# Altium schematic symbol library Capacitor - Aluminium TH.SchLib: 4591 symbols (part 3 of 27) (continued)
## 228CKS050M (continued)
CAP ALUM 2200UF 20% 50V T/H; Part Number: 228CKS050M; Manufacturer: Illinois Capacitor; TemperatureRange: -40C ~ 85C; Type: Polar; Ripple Current: 2.39A @ 120Hz; Value: 2200uF; PartId: 27371; Supplier 1: Digi-Key; Supplier Part Number 1: 1572-1413-ND; ComponentLink1Description: Datasheet; ComponentLink1URL: http://www.illinoiscapacitor.com/pdf/seriesDocuments/CKR_CKS%20series.pdf; ComponentLink2Description: Digi-Key Listing; ComponentLink2URL: https://www.digikey.com/product-detail/en/illinois-capacitor/228CKS050M/1572-1413-ND/5411845; Tolerance: 20%; Voltage: 50V; Price: 1.79; Device Package: Radial, Can, 16mm
footprint CAP AL TH D16 L7.5 H37
pins: 1, 2

## 228KXM016M
designator C?, comment 2200uF  (value not drawn)
CAP ALUM 2200UF 20% 16V T/H; Part Number: 228KXM016M; Manufacturer: Illinois Capacitor; TemperatureRange: -55C ~ 105C; Type: Polar; Ripple Current: 2.078A @ 120Hz; Impedance: 45 mOhm; Value: 2200uF; PartId: 23862; Supplier 1: Digi-Key; Supplier Part Number 1: 1572-1414-ND; ComponentLink1Description: Datasheet; ComponentLink1URL: http://www.illinoiscapacitor.com/pdf/seriesDocuments/KXM%20series.pdf; ComponentLink2Description: Digi-Key Listing; ComponentLink2URL: https://www.digikey.com/product-detail/en/illinois-capacitor/228KXM016M/1572-1414-ND/5411851; Tolerance: 20%; Voltage: 16V; Price: 0.74; Device Package: Radial, Can, 12.5mm
footprint CAP AL TH D12.5 L5 H27
pins: 1, 2

## 250BXC10MEFC10X16
designator C?, comment 10uF  (value not drawn)
CAP ALUM 10UF 20% 250V RADIAL; Part Number: 250BXC10MEFC10X16; Manufacturer: Rubycon; TemperatureRange: -25C ~ 105C; Type: Polar; Ripple Current: 96mA @ 120Hz; Value: 10uF; PartId: 25606; Supplier 1: Digi-Key; Supplier Part Number 1: 1189-3680-ND; ComponentLink1Description: Datasheet; ComponentLink1URL: http://www.rubycon.co.jp/en/catalog/e_pdfs/aluminum/e_bxc.pdf; ComponentLink2Description: Digi-Key Listing; ComponentLink2URL: https://www.digikey.com/product-detail/en/rubycon/250BXC10MEFC10X16/1189-3680-ND/3563641; Tolerance: 20%; Voltage: 250V; Price: 0.69; Device Package: Radial, Can, 10mm
footprint CAP AL TH D10 L5 H22
pins: 1, 2

## 250BXC22MEFC10X16
designator C?, comment 22uF  (value not drawn)
CAP ALUM 22UF 20% 250V RADIAL; Part Number: 250BXC22MEFC10X16; Manufacturer: Rubycon; TemperatureRange: -25C ~ 105C; Type: Polar; Ripple Current: 188mA; Value: 22uF; PartId: 25542; Supplier 1: Digi-Key; Supplier Part Number 1: 1189-1892-ND; ComponentLink1Description: Datasheet; ComponentLink1URL: http://www.rubycon.co.jp/en/catalog/e_pdfs/aluminum/e_bxc.pdf; ComponentLink2Description: Digi-Key Listing; ComponentLink2URL: https://www.digikey.com/product-detail/en/rubycon/250BXC22MEFC10X16/1189-1892-ND/3563640; Tolerance: 20%; Voltage: 250V; Price: 0.63; Device Package: Radial, Can, 10mm
footprint CAP AL TH D10 L5 H22
pins: 1, 2

## 250BXC22MEFC10X20
designator C?, comment 22uF  (value not drawn)
CAP ALUM 22UF 20% 250V RADIAL; Part Number: 250BXC22MEFC10X20; Manufacturer: Rubycon; TemperatureRange: -25C ~ 105C; Type: Polar; Ripple Current: 200mA; Value: 22uF; PartId: 25955; Supplier 1: Digi-Key; Supplier Part Number 1: 1189-2213-ND; ComponentLink1Description: Datasheet; ComponentLink1URL: http://www.rubycon.co.jp/en/catalog/e_pdfs/aluminum/e_bxc.pdf; ComponentLink2Description: Digi-Key Listing; ComponentLink2URL: https://www.digikey.com/product-detail/en/rubycon/250BXC22MEFC10X20/1189-2213-ND/3563741; Tolerance: 20%; Voltage: 250V; Price: 0.79; Device Package: Radial, Can, 10mm
footprint CAP AL TH D10 L5 H22
pins: 1, 2

## 250BXC47MEFC12.5X20
designator C?, comment 47uF  (value not drawn)
CAP ALUM 47UF 20% 250V RADIAL; Part Number: 250BXC47MEFC12.5X20; Manufacturer: Rubycon; TemperatureRange: -25C ~ 105C; Type: Polar; Ripple Current: 392mA; Value: 47uF; PartId: 23382; Supplier 1: Digi-Key; Supplier Part Number 1: 1189-2215-ND; ComponentLink1Description: Datasheet; ComponentLink1URL: http://www.rubycon.co.jp/en/catalog/e_pdfs/aluminum/e_bxc.pdf; ComponentLink2Description: Digi-Key Listing; ComponentLink2URL: https://www.digikey.com/product-detail/en/rubycon/250BXC47MEFC12.5X20/1189-2215-ND/3563982; Tolerance: 20%; Voltage: 250V; Price: 0.93; Device Package: Radial, Can, 12.5mm
footprint CAP AL TH D12.5 L5 H22
pins: 1, 2

## 250BXC68MEFC16X20
designator C?, comment 68uF  (value not drawn)
CAP ALUM 68UF 20% 250V RADIAL; Part Number: 250BXC68MEFC16X20; Manufacturer: Rubycon; TemperatureRange: -25C ~ 105C; Type: Polar; Ripple Current: 520mA; Value: 68uF; PartId: 26443; Supplier 1: Digi-Key; Supplier Part Number 1: 1189-2216-ND; ComponentLink1Description: Datasheet; ComponentLink1URL: http://www.rubycon.co.jp/en/catalog/e_pdfs/aluminum/e_bxc.pdf; ComponentLink2Description: Digi-Key Listing; ComponentLink2URL: https://www.digikey.com/product-detail/en/rubycon/250BXC68MEFC16X20/1189-2216-ND/3564349; Tolerance: 20%; Voltage: 250V; Price: 1.42; Device Package: Radial, Can, 16mm
footprint CAP AL TH D16 L7.5 H22
pins: 1, 2

## 250BXC100MEFC16X25
designator C?, comment 100uF  (value not drawn)
CAP ALUM 100UF 20% 250V RADIAL; Part Number: 250BXC100MEFC16X25; Manufacturer: Rubycon; TemperatureRange: -25C ~ 105C; Type: Polar; Ripple Current: 689mA; Value: 100uF; PartId: 26920; Supplier 1: Digi-Key; Supplier Part Number 1: 1189-2212-ND; ComponentLink1Description: Datasheet; ComponentLink1URL: http://www.rubycon.co.jp/en/catalog/e_pdfs/aluminum/e_bxc.pdf; ComponentLink2Description: Digi-Key Listing; ComponentLink2URL: https://www.digikey.com/product-detail/en/rubycon/250BXC100MEFC16X25/1189-2212-ND/3564423; Tolerance: 20%; Voltage: 250V; Price: 1.7; Device Package: Radial, Can, 16mm
footprint CAP AL TH D16 L7.5 H27
pins: 1, 2

## 250CFX10MEFC10X16
designator C?, comment 10uF  (value not drawn)
CAP ALUM 10UF 20% 250V RADIAL; Part Number: 250CFX10MEFC10X16; Manufacturer: Rubycon; TemperatureRange: -25C ~ 105C; Type: Polar; Ripple Current: 90mA; Value: 10uF; PartId: 25586; Supplier 1: Digi-Key; Supplier Part Number 1: 1189-2217-ND; ComponentLink1Description: Datasheet; ComponentLink1URL: http://www.rubycon.co.jp/en/catalog/e_pdfs/aluminum/e_cfx.pdf; ComponentLink2Description: Digi-Key Listing; ComponentLink2URL: https://www.digikey.com/product-detail/en/rubycon/250CFX10MEFC10X16/1189-2217-ND/3563655; Tolerance: 20%; Voltage: 250V; Price: 0.67; Device Package: Radial, Can, 10mm
footprint CAP AL TH D10 L5 H22
pins: 1, 2

## 250CFX22MEFC10X20
designator C?, comment 22uF  (value not drawn)
CAP ALUM 22UF 20% 250V RADIAL; Part Number: 250CFX22MEFC10X20; Manufacturer: Rubycon; TemperatureRange: -25C ~ 105C; Type: Polar; Ripple Current: 250mA; Value: 22uF; PartId: 25880; Supplier 1: Digi-Key; Supplier Part Number 1: 1189-2911-ND; ComponentLink1Description: Datasheet; ComponentLink1URL: http://www.rubycon.co.jp/en/catalog/e_pdfs/aluminum/e_cfx.pdf; ComponentLink2Description: Digi-Key Listing; ComponentLink2URL: https://www.digikey.com/product-detail/en/rubycon/250CFX22MEFC10X20/1189-2911-ND/3563753; Tolerance: 20%; Voltage: 250V; Price: 0.64; Device Package: Radial, Can, 10mm
footprint CAP AL TH D10 L5 H22
pins: 1, 2

## 250LEX8.2MEFC10X9
designator C?, comment 8.2uF  (value not drawn)
CAP ALUM 8.2UF 20% 250V RADIAL; Part Number: 250LEX8.2MEFC10X9; Manufacturer: Rubycon; TemperatureRange: -40C ~ 125C; Type: Polar; Ripple Current: 76mA; Value: 8.2uF; PartId: 24483; Supplier 1: Digi-Key; Supplier Part Number 1: 1189-2715-ND; ComponentLink1Description: Datasheet; ComponentLink1URL: http://www.rubycon.co.jp/en/catalog/e_pdfs/aluminum/e_lex.pdf; ComponentLink2Description: Digi-Key Listing; ComponentLink2URL: https://www.digikey.com/product-detail/en/rubycon/250LEX8.2MEFC10X9/1189-2715-ND/5051844; Tolerance: 20%; Voltage: 250V; Price: 0.67; Device Package: Radial, Can, 10mm
footprint CAP AL TH D10 L5 H12.5
pins: 1, 2

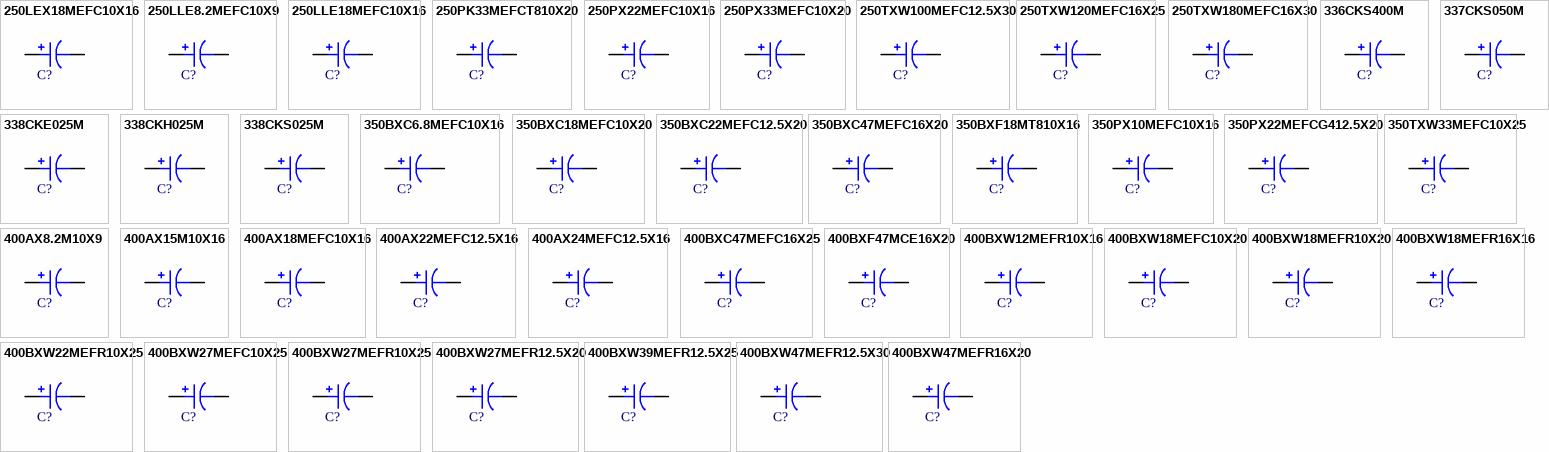
[diagram p10: symbols 250LEX18MEFC10X16 to 400BXW47MEFR16X20]

## 250LEX18MEFC10X16
designator C?, comment 18uF  (value not drawn)
CAP ALUM 18UF 20% 250V RADIAL; Part Number: 250LEX18MEFC10X16; Manufacturer: Rubycon; TemperatureRange: -40C ~ 125C; Type: Polar; Ripple Current: 127mA; Value: 18uF; PartId: 25697; Supplier 1: Digi-Key; Supplier Part Number 1: 1189-2718-ND; ComponentLink1Description: Datasheet; ComponentLink1URL: http://www.rubycon.co.jp/en/catalog/e_pdfs/aluminum/e_lex.pdf; ComponentLink2Description: Digi-Key Listing; ComponentLink2URL: https://www.digikey.com/product-detail/en/rubycon/250LEX18MEFC10X16/1189-2718-ND/5051847; Tolerance: 20%; Voltage: 250V; Price: 0.83; Device Package: Radial, Can, 10mm
footprint CAP AL TH D10 L5 H22
pins: 1, 2

## 250LLE8.2MEFC10X9
designator C?, comment 8.2uF  (value not drawn)
CAP ALUM 8.2UF 20% 250V RADIAL; Part Number: 250LLE8.2MEFC10X9; Manufacturer: Rubycon; TemperatureRange: -40C ~ 105C; Ripple Current: 76mA; Value: 8.2uF; PartId: 24470; Supplier 1: Digi-Key; Supplier Part Number 1: 1189-2226-ND; ComponentLink1Description: Datasheet; ComponentLink1URL: http://www.rubycon.co.jp/en/catalog/e_pdfs/aluminum/e_lle.pdf; ComponentLink2Description: Digi-Key Listing; ComponentLink2URL: https://www.digikey.com/product-detail/en/rubycon/250LLE8.2MEFC10X9/1189-2226-ND/4842255; Tolerance: 20%; Voltage: 250V; Price: 0.58; Device Package: Radial, Can, 10mm
footprint CAP AL TH D10 L5 H12.5
pins: 1, 2

## 250LLE18MEFC10X16
designator C?, comment 18uF  (value not drawn)
CAP ALUM 18UF 20% 250V RADIAL; Part Number: 250LLE18MEFC10X16; Manufacturer: Rubycon; TemperatureRange: -40C ~ 105C; Ripple Current: 127mA; Value: 18uF; PartId: 25595; Supplier 1: Digi-Key; Supplier Part Number 1: 1189-2221-ND; ComponentLink1Description: Datasheet; ComponentLink1URL: http://www.rubycon.co.jp/en/catalog/e_pdfs/aluminum/e_lle.pdf; ComponentLink2Description: Digi-Key Listing; ComponentLink2URL: https://www.digikey.com/product-detail/en/rubycon/250LLE18MEFC10X16/1189-2221-ND/4842250; Tolerance: 20%; Voltage: 250V; Price: 0.68; Device Package: Radial, Can, 10mm
footprint CAP AL TH D10 L5 H22
pins: 1, 2

## 250PK33MEFCT810X20
designator C?, comment 33uF  (value not drawn)
CAP ALUM 33UF 20% 250V RADIAL; Part Number: 250PK33MEFCT810X20; Manufacturer: Rubycon; TemperatureRange: -40C ~ 85C; Ripple Current: 205mA; Value: 33uF; PartId: 25809; Supplier 1: Digi-Key; Supplier Part Number 1: 1189-1580-2-ND; ComponentLink1Description: Datasheet; ComponentLink1URL: http://www.rubycon.co.jp/en/catalog/e_pdfs/aluminum/e_pk.pdf; ComponentLink2Description: Digi-Key Listing; ComponentLink2URL: https://www.digikey.com/product-detail/en/rubycon/250PK33MEFCT810X20/1189-1580-2-ND/3134860; Tolerance: 20%; Voltage: 250V; Price: 0.3289; Device Package: Radial, Can, 10mm
footprint CAP AL TH D10 L5 H22
pins: 1, 2

## 250PX22MEFC10X16
designator C?, comment 22uF  (value not drawn)
CAP ALUM 22UF 20% 250V RADIAL; Part Number: 250PX22MEFC10X16; Manufacturer: Rubycon; TemperatureRange: -40C ~ 105C; Type: Polar; Ripple Current: 105mA; Value: 22uF; PartId: 25603; Supplier 1: Digi-Key; Supplier Part Number 1: 1189-1206-ND; ComponentLink1Description: Datasheet; ComponentLink1URL: http://www.rubycon.co.jp/en/catalog/e_pdfs/aluminum/e_px.pdf; ComponentLink2Description: Digi-Key Listing; ComponentLink2URL: https://www.digikey.com/product-detail/en/rubycon/250PX22MEFC10X16/1189-1206-ND/3134163; Tolerance: 20%; Voltage: 250V; Price: 0.69; Device Package: Radial, Can, 10mm
footprint CAP AL TH D10 L5 H22
pins: 1, 2

## 250PX33MEFC10X20
designator C?, comment 33uF  (value not drawn)
CAP ALUM 33UF 20% 250V RADIAL; Part Number: 250PX33MEFC10X20; Manufacturer: Rubycon; TemperatureRange: -40C ~ 105C; Type: Polar; Ripple Current: 140mA; Value: 33uF; PartId: 25964; Supplier 1: Digi-Key; Supplier Part Number 1: 1189-1208-ND; ComponentLink1Description: Datasheet; ComponentLink1URL: http://www.rubycon.co.jp/en/catalog/e_pdfs/aluminum/e_px.pdf; ComponentLink2Description: Digi-Key Listing; ComponentLink2URL: https://www.digikey.com/product-detail/en/rubycon/250PX33MEFC10X20/1189-1208-ND/3134165; Tolerance: 20%; Voltage: 250V; Price: 0.84; Device Package: Radial, Can, 10mm
footprint CAP AL TH D10 L5 H22
pins: 1, 2

## 250TXW100MEFC12.5X30
designator C?, comment 100uF  (value not drawn)
CAP ALUM 100UF 20% 250V RADIAL; Part Number: 250TXW100MEFC12.5X30; Manufacturer: Rubycon; TemperatureRange: -25C ~ 105C; Type: Polar; Ripple Current: 690mA; Value: 100uF; PartId: 24404; Supplier 1: Digi-Key; Supplier Part Number 1: 1189-1209-ND; ComponentLink1Description: Datasheet; ComponentLink1URL: http://www.rubycon.co.jp/en/catalog/e_pdfs/aluminum/e_txw.pdf; ComponentLink2Description: Digi-Key Listing; ComponentLink2URL: https://www.digikey.com/product-detail/en/rubycon/250TXW100MEFC12.5X30/1189-1209-ND/3134166; Tolerance: 20%; Voltage: 250V; Price: 1.92; Device Package: Radial, Can, 12.5mm
footprint CAP AL TH D12.5 L5 H35.5
pins: 1, 2

## 250TXW120MEFC16X25
designator C?, comment 120uF  (value not drawn)
CAP ALUM 120UF 20% 250V RADIAL; Part Number: 250TXW120MEFC16X25; Manufacturer: Rubycon; TemperatureRange: -25C ~ 105C; Type: Polar; Ripple Current: 740mA; Value: 120uF; PartId: 27257; Supplier 1: Digi-Key; Supplier Part Number 1: 1189-1210-ND; ComponentLink1Description: Datasheet; ComponentLink1URL: http://www.rubycon.co.jp/en/catalog/e_pdfs/aluminum/e_txw.pdf; ComponentLink2Description: Digi-Key Listing; ComponentLink2URL: https://www.digikey.com/product-detail/en/rubycon/250TXW120MEFC16X25/1189-1210-ND/3134167; Tolerance: 20%; Voltage: 250V; Price: 2.77; Device Package: Radial, Can, 16mm
footprint CAP AL TH D16 L7.5 H33.5
pins: 1, 2

## 250TXW180MEFC16X30
designator C?, comment 180uF  (value not drawn)
CAP ALUM 180UF 20% 250V RADIAL; Part Number: 250TXW180MEFC16X30; Manufacturer: Rubycon; TemperatureRange: -25C ~ 105C; Type: Polar; Ripple Current: 950mA; Value: 180uF; PartId: 27234; Supplier 1: Digi-Key; Supplier Part Number 1: 1189-1767-ND; ComponentLink1Description: Datasheet; ComponentLink1URL: http://www.rubycon.co.jp/en/catalog/e_pdfs/aluminum/e_txw.pdf; ComponentLink2Description: Digi-Key Listing; ComponentLink2URL: https://www.digikey.com/product-detail/en/rubycon/250TXW180MEFC16X30/1189-1767-ND/3564511; Tolerance: 20%; Voltage: 250V; Price: 2.47; Device Package: Radial, Can, 16mm
footprint CAP AL TH D16 L7.5 H33.5
pins: 1, 2

## 336CKS400M
designator C?, comment 33uF  (value not drawn)
CAP ALUM 33UF 20% 400V THRU HOLE; Part Number: 336CKS400M; Manufacturer: Illinois Capacitor; TemperatureRange: -25C ~ 85C; Type: Polar; Ripple Current: 260mA @ 120Hz; Value: 33uF; PartId: 26665; Supplier 1: Digi-Key; Supplier Part Number 1: 1572-1428-ND; ComponentLink1Description: Datasheet; ComponentLink1URL: http://www.illinoiscapacitor.com/pdf/seriesDocuments/CKR_CKS%20series.pdf; ComponentLink2Description: Digi-Key Listing; ComponentLink2URL: https://www.digikey.com/product-detail/en/illinois-capacitor/336CKS400M/1572-1428-ND/5412237; Tolerance: 20%; Voltage: 400V; Price: 1.63; Device Package: Radial, Can, 16mm
footprint CAP AL TH D16 L7.5 H26.5
pins: 1, 2

## 337CKS050M
designator C?, comment 330uF  (value not drawn)
CAP ALUM 330UF 20% 50V THRU HOLE; Part Number: 337CKS050M; Manufacturer: Illinois Capacitor; TemperatureRange: -40C ~ 85C; Type: Polar; Ripple Current: 710mA @ 120Hz; Value: 330uF; PartId: 25247; Supplier 1: Digi-Key; Supplier Part Number 1: 1572-1438-ND; ComponentLink1Description: Datasheet; ComponentLink1URL: http://www.illinoiscapacitor.com/pdf/seriesDocuments/CKR_CKS%20series.pdf; ComponentLink2Description: Digi-Key Listing; ComponentLink2URL: https://www.digikey.com/product-detail/en/illinois-capacitor/337CKS050M/1572-1438-ND/5412323; Tolerance: 20%; Voltage: 50V; Price: 0.57; Device Package: Radial, Can, 10mm
footprint CAP AL TH D10 L5 H17.5
pins: 1, 2

## 338CKE025M
designator C?, comment 3300uF  (value not drawn)
CAP ALUM 3300UF 20% 25V RADIAL; Part Number: 338CKE025M; Manufacturer: Illinois Capacitor; TemperatureRange: -40C ~ 105C; Type: Polar; Ripple Current: 1.645A; Value: 3300uF; PartId: 26635; Supplier 1: Digi-Key; Supplier Part Number 1: 1572-1127-ND; ComponentLink1Description: Datasheet; ComponentLink1URL: http://www.illinoiscapacitor.com/pdf/seriesDocuments/CKH_CKE%20series.pdf; ComponentLink2Description: Digi-Key Listing; ComponentLink2URL: https://www.digikey.com/product-detail/en/illinois-capacitor/338CKE025M/1572-1127-ND/5344057; Tolerance: 20%; Voltage: 25V; Price: 1.48; Device Package: Radial, Can, 16mm
footprint CAP AL TH D16 L7.5 H26.5
pins: 1, 2

## 338CKH025M
designator C?, comment 3300uF  (value not drawn)
CAP ALUM 3300UF 20% 25V T/H; Part Number: 338CKH025M; Manufacturer: Illinois Capacitor; TemperatureRange: -40C ~ 105C; Type: Polar; Ripple Current: 1.8A @ 120Hz; Value: 3300uF; PartId: 27023; Supplier 1: Digi-Key; Supplier Part Number 1: 1572-1441-ND; ComponentLink1Description: Datasheet; ComponentLink1URL: http://www.illinoiscapacitor.com/pdf/seriesDocuments/CKH_CKE%20series.pdf; ComponentLink2Description: Digi-Key Listing; ComponentLink2URL: https://www.digikey.com/product-detail/en/illinois-capacitor/338CKH025M/1572-1441-ND/5412415; Tolerance: 20%; Voltage: 25V; Price: 1.47; Device Package: Radial, Can, 16mm
footprint CAP AL TH D16 L7.5 H33.5
pins: 1, 2

## 338CKS025M
designator C?, comment 3300uF  (value not drawn)
RADIAL 85C LYTIC; Part Number: 338CKS025M; Manufacturer: Illinois Capacitor; TemperatureRange: -40C ~ 85C; Tolerance: 20%; Voltage: 25V; Type: Polar; Ripple Current: 2.305A; Value: 3300uF; PartId: 26673; Supplier 1: Digi-Key; Supplier Part Number 1: 1572-1128-ND; ComponentLink1Description: Datasheet; ComponentLink1URL: http://www.illinoiscapacitor.com/pdf/seriesDocuments/CKR_CKS%20series.pdf; ComponentLink2Description: Digi-Key Listing; ComponentLink2URL: https://www.digikey.com/product-detail/en/illinois-capacitor/338CKS025M/1572-1128-ND/5344058; Price: 1.77; Device Package: Radial, Can, 16mm
footprint CAP AL TH D16 L7.5 H26.5
pins: 1, 2

## 350BXC6.8MEFC10X16
designator C?, comment 6.8uF  (value not drawn)
CAP ALUM 6.8UF 20% 350V RADIAL; Part Number: 350BXC6.8MEFC10X16; Manufacturer: Rubycon; TemperatureRange: -25C ~ 105C; Type: Polar; Ripple Current: 84mA; Value: 6.8uF; PartId: 25625; Supplier 1: Digi-Key; Supplier Part Number 1: 1189-2247-ND; ComponentLink1Description: Datasheet; ComponentLink1URL: http://www.rubycon.co.jp/en/catalog/e_pdfs/aluminum/e_bxc.pdf; ComponentLink2Description: Digi-Key Listing; ComponentLink2URL: https://www.digikey.com/product-detail/en/rubycon/350BXC6.8MEFC10X16/1189-2247-ND/3563635; Tolerance: 20%; Voltage: 350V; Price: 0.71; Device Package: Radial, Can, 10mm
footprint CAP AL TH D10 L5 H22
pins: 1, 2

## 350BXC18MEFC10X20
designator C?, comment 18uF  (value not drawn)
CAP ALUM 18UF 20% 350V T/H; Part Number: 350BXC18MEFC10X20; Manufacturer: Rubycon; TemperatureRange: -25C ~ 105C; Type: Polar; Ripple Current: 105mA @ 120Hz; Value: 18uF; PartId: 25881; Supplier 1: Digi-Key; Supplier Part Number 1: 1189-3125-ND; ComponentLink1Description: Datasheet; ComponentLink1URL: http://www.rubycon.co.jp/en/catalog/e_pdfs/aluminum/e_bxc.pdf; ComponentLink2Description: Digi-Key Listing; ComponentLink2URL: https://www.digikey.com/product-detail/en/rubycon/350BXC18MEFC10X20/1189-3125-ND/6049845; Tolerance: 20%; Voltage: 350V; Price: 0.64; Device Package: Radial, Can, 10mm
footprint CAP AL TH D10 L5 H22
pins: 1, 2

## 350BXC22MEFC12.5X20
designator C?, comment 22uF  (value not drawn)
CAP ALUM 22UF 20% 350V RADIAL; Part Number: 350BXC22MEFC12.5X20; Manufacturer: Rubycon; TemperatureRange: -25C ~ 105C; Type: Polar; Ripple Current: 260mA; Value: 22uF; PartId: 23390; Supplier 1: Digi-Key; Supplier Part Number 1: 1189-2245-ND; ComponentLink1Description: Datasheet; ComponentLink1URL: http://www.rubycon.co.jp/en/catalog/e_pdfs/aluminum/e_bxc.pdf; ComponentLink2Description: Digi-Key Listing; ComponentLink2URL: https://www.digikey.com/product-detail/en/rubycon/350BXC22MEFC12.5X20/1189-2245-ND/3563985; Tolerance: 20%; Voltage: 350V; Price: 0.95; Device Package: Radial, Can, 12.5mm
footprint CAP AL TH D12.5 L5 H22
pins: 1, 2

## 350BXC47MEFC16X20
designator C?, comment 47uF  (value not drawn)
CAP ALUM 47UF 20% 350V RADIAL; Part Number: 350BXC47MEFC16X20; Manufacturer: Rubycon; TemperatureRange: -25C ~ 105C; Type: Polar; Ripple Current: 432mA; Value: 47uF; PartId: 26489; Supplier 1: Digi-Key; Supplier Part Number 1: 1189-2246-ND; ComponentLink1Description: Datasheet; ComponentLink1URL: http://www.rubycon.co.jp/en/catalog/e_pdfs/aluminum/e_bxc.pdf; ComponentLink2Description: Digi-Key Listing; ComponentLink2URL: https://www.digikey.com/product-detail/en/rubycon/350BXC47MEFC16X20/1189-2246-ND/3564350; Tolerance: 20%; Voltage: 350V; Price: 1.86; Device Package: Radial, Can, 16mm
footprint CAP AL TH D16 L7.5 H22
pins: 1, 2

## 350BXF18MT810X16
designator C?, comment 18uF  (value not drawn)
CAP ALUM 18UF 20% 350V RADIAL; Part Number: 350BXF18MT810X16; Manufacturer: Rubycon; TemperatureRange: -25C ~ 105C; Ripple Current: 135mA; Value: 18uF; PartId: 25507; Supplier 1: Digi-Key; Supplier Part Number 1: 1189-1616-3-ND; ComponentLink1Description: Datasheet; ComponentLink1URL: http://www.rubycon.co.jp/en/catalog/e_pdfs/aluminum/e_bxf.pdf; ComponentLink2Description: Digi-Key Listing; ComponentLink2URL: https://www.digikey.com/product-detail/en/rubycon/350BXF18MT810X16/1189-1616-3-ND/3134896; Tolerance: 20%; Voltage: 350V; Price: 0.496; Device Package: Radial, Can, 10mm
footprint CAP AL TH D10 L5 H22
pins: 1, 2

## 350PX10MEFC10X16
designator C?, comment 10uF  (value not drawn)
CAP ALUM 10UF 20% 350V RADIAL; Part Number: 350PX10MEFC10X16; Manufacturer: Rubycon; TemperatureRange: -40C ~ 105C; Type: Polar; Ripple Current: 95mA; Value: 10uF; PartId: 25513; Supplier 1: Digi-Key; Supplier Part Number 1: 1189-1256-ND; ComponentLink1Description: Datasheet; ComponentLink1URL: http://www.rubycon.co.jp/en/catalog/e_pdfs/aluminum/e_px.pdf; ComponentLink2Description: Digi-Key Listing; ComponentLink2URL: https://www.digikey.com/product-detail/en/rubycon/350PX10MEFC10X16/1189-1256-ND/3134212; Tolerance: 20%; Voltage: 350V; Price: 0.56; Device Package: Radial, Can, 10mm
footprint CAP AL TH D10 L5 H22
pins: 1, 2

## 350PX22MEFCG412.5X20
designator C?, comment 22uF  (value not drawn)
CAP ALUM 22UF 20% 350V RADIAL; Part Number: 350PX22MEFCG412.5X20; Manufacturer: Rubycon; TemperatureRange: -40C ~ 105C; Type: Polar; Ripple Current: 175mA; Value: 22uF; PartId: 23478; Supplier 1: Digi-Key; Supplier Part Number 1: 1189-1617-1-ND; ComponentLink1Description: Datasheet; ComponentLink1URL: http://www.rubycon.co.jp/en/catalog/e_pdfs/aluminum/e_px.pdf; ComponentLink2Description: Digi-Key Listing; ComponentLink2URL: https://www.digikey.com/product-detail/en/rubycon/350PX22MEFCG412.5X20/1189-1617-1-ND/3134574; Tolerance: 20%; Voltage: 350V; Price: 1.13; Device Package: Radial, Can, 12.5mm
footprint CAP AL TH D12.5 L5 H22
pins: 1, 2

## 350TXW33MEFC10X25
designator C?, comment 33uF  (value not drawn)
CAP ALUM 33UF 20% 350V RADIAL; Part Number: 350TXW33MEFC10X25; Manufacturer: Rubycon; TemperatureRange: -25C ~ 105C; Type: Polar; Ripple Current: 310mA; Value: 33uF; PartId: 26202; Supplier 1: Digi-Key; Supplier Part Number 1: 1189-1260-ND; ComponentLink1Description: Datasheet; ComponentLink1URL: http://www.rubycon.co.jp/en/catalog/e_pdfs/aluminum/e_txw.pdf; ComponentLink2Description: Digi-Key Listing; ComponentLink2URL: https://www.digikey.com/product-detail/en/rubycon/350TXW33MEFC10X25/1189-1260-ND/3134216; Tolerance: 20%; Voltage: 350V; Price: 1.75; Device Package: Radial, Can, 10mm
footprint CAP AL TH D10 L5 H30
pins: 1, 2

## 400AX8.2M10X9
designator C?, comment 8.2uF  (value not drawn)
CAP ALUM 8.2UF 20% 400V RADIAL; Part Number: 400AX8.2M10X9; Manufacturer: Rubycon; TemperatureRange: -40C ~ 105C; Ripple Current: 85mA; Value: 8.2uF; PartId: 24474; Supplier 1: Digi-Key; Supplier Part Number 1: 1189-2278-ND; ComponentLink1Description: Datasheet; ComponentLink1URL: http://www.rubycon.co.jp/en/catalog/e_pdfs/aluminum/e_ax.pdf; ComponentLink2Description: Digi-Key Listing; ComponentLink2URL: https://www.digikey.com/product-detail/en/rubycon/400AX8.2M10X9/1189-2278-ND/4842257; Tolerance: 20%; Voltage: 400V; Price: 0.63; Device Package: Radial, Can, 10mm
footprint CAP AL TH D10 L5 H12.5
pins: 1, 2

## 400AX15M10X16
designator C?, comment 15uF  (value not drawn)
CAP ALUM 15UF 20% 400V RADIAL; Part Number: 400AX15M10X16; Manufacturer: Rubycon; TemperatureRange: -40C ~ 105C; Ripple Current: 150mA; Value: 15uF; PartId: 25709; Supplier 1: Digi-Key; Supplier Part Number 1: 1189-2275-ND; ComponentLink1Description: Datasheet; ComponentLink1URL: http://www.rubycon.co.jp/en/catalog/e_pdfs/aluminum/e_ax.pdf; ComponentLink2Description: Digi-Key Listing; ComponentLink2URL: https://www.digikey.com/product-detail/en/rubycon/400AX15M10X16/1189-2275-ND/3563632; Tolerance: 20%; Voltage: 400V; Price: 1.03; Device Package: Radial, Can, 10mm
footprint CAP AL TH D10 L5 H22
pins: 1, 2

## 400AX18MEFC10X16
designator C?, comment 18uF  (value not drawn)
CAP ALUM 18UF 20% 400V T/H; Part Number: 400AX18MEFC10X16; Manufacturer: Rubycon; TemperatureRange: -40C ~ 105C; Type: Polar; Ripple Current: 150mA @ 120Hz; Value: 18uF; PartId: 25640; Supplier 1: Digi-Key; Supplier Part Number 1: 1189-3122-ND; ComponentLink1Description: Datasheet; ComponentLink1URL: http://www.rubycon.co.jp/en/catalog/e_pdfs/aluminum/e_ax.pdf; ComponentLink2Description: Digi-Key Listing; ComponentLink2URL: https://www.digikey.com/product-detail/en/rubycon/400AX18MEFC10X16/1189-3122-ND/6049842; Tolerance: 20%; Voltage: 400V; Price: 0.73; Device Package: Radial, Can, 10mm
footprint CAP AL TH D10 L5 H22
pins: 1, 2

## 400AX22MEFC12.5X16
designator C?, comment 22uF  (value not drawn)
CAP ALUM 22UF 20% 400V T/H; Part Number: 400AX22MEFC12.5X16; Manufacturer: Rubycon; TemperatureRange: -40C ~ 105C; Type: Polar; Ripple Current: 180mA @ 120Hz; Value: 22uF; PartId: 22913; Supplier 1: Digi-Key; Supplier Part Number 1: 1189-3123-ND; ComponentLink1Description: Datasheet; ComponentLink1URL: http://www.rubycon.co.jp/en/catalog/e_pdfs/aluminum/e_ax.pdf; ComponentLink2Description: Digi-Key Listing; ComponentLink2URL: https://www.digikey.com/product-detail/en/rubycon/400AX22MEFC12.5X16/1189-3123-ND/6049843; Tolerance: 20%; Voltage: 400V; Price: 0; Device Package: Radial, Can, 12.5mm
footprint CAP AL TH D12.5 L5 H20
pins: 1, 2

## 400AX24MEFC12.5X16
designator C?, comment 24uF  (value not drawn)
CAP ALUM 24UF 20% 400V T/H; Part Number: 400AX24MEFC12.5X16; Manufacturer: Rubycon; TemperatureRange: -40C ~ 105C; Type: Polar; Ripple Current: 190mA @ 120Hz; Value: 24uF; PartId: 22919; Supplier 1: Digi-Key; Supplier Part Number 1: 1189-3124-ND; ComponentLink1Description: Datasheet; ComponentLink1URL: http://www.rubycon.co.jp/en/catalog/e_pdfs/aluminum/e_ax.pdf; ComponentLink2Description: Digi-Key Listing; ComponentLink2URL: https://www.digikey.com/product-detail/en/rubycon/400AX24MEFC12.5X16/1189-3124-ND/6049844; Tolerance: 20%; Voltage: 400V; Price: 0; Device Package: Radial, Can, 12.5mm
footprint CAP AL TH D12.5 L5 H20
pins: 1, 2

## 400BXC47MEFC16X25
designator C?, comment 47uF  (value not drawn)
CAP ALUM 47UF 20% 400V RADIAL; Part Number: 400BXC47MEFC16X25; Manufacturer: Rubycon; TemperatureRange: -25C ~ 105C; Type: Polar; Ripple Current: 472mA; Value: 47uF; PartId: 26961; Supplier 1: Digi-Key; Supplier Part Number 1: 1189-2281-ND; ComponentLink1Description: Datasheet; ComponentLink1URL: http://www.rubycon.co.jp/en/catalog/e_pdfs/aluminum/e_bxc.pdf; ComponentLink2Description: Digi-Key Listing; ComponentLink2URL: https://www.digikey.com/product-detail/en/rubycon/400BXC47MEFC16X25/1189-2281-ND/3564420; Tolerance: 20%; Voltage: 400V; Price: 2.14; Device Package: Radial, Can, 16mm
footprint CAP AL TH D16 L7.5 H27
pins: 1, 2

## 400BXF47MCE16X20
designator C?, comment 47uF  (value not drawn)
CAP ALUM 47UF 20% 400V RADIAL; Part Number: 400BXF47MCE16X20; Manufacturer: Rubycon; TemperatureRange: -25C ~ 105C; Ripple Current: 480mA; Value: 47uF; PartId: 26501; Supplier 1: Digi-Key; Supplier Part Number 1: 1189-1308-ND; ComponentLink1Description: Datasheet; ComponentLink1URL: http://www.rubycon.co.jp/en/catalog/e_pdfs/aluminum/e_bxf.pdf; ComponentLink2Description: Digi-Key Listing; ComponentLink2URL: https://www.digikey.com/product-detail/en/rubycon/400BXF47MCE16X20/1189-1308-ND/3134264; Tolerance: 20%; Voltage: 400V; Price: 2.43; Device Package: Radial, Can, 16mm
footprint CAP AL TH D16 L7.5 H22
pins: 1, 2

## 400BXW12MEFR10X16
designator C?, comment 12uF  (value not drawn)
CAP ALUM 12UF 20% 400V T/H; Part Number: 400BXW12MEFR10X16; Manufacturer: Rubycon; TemperatureRange: -40C ~ 105C; Type: Polar; Ripple Current: 160mA @ 120Hz; Value: 12uF; PartId: 25711; Supplier 1: Digi-Key; Supplier Part Number 1: 1189-3126-ND; ComponentLink1Description: Datasheet; ComponentLink1URL: http://www.rubycon.co.jp/en/catalog/e_pdfs/aluminum/e_BXW.pdf; ComponentLink2Description: Digi-Key Listing; ComponentLink2URL: https://www.digikey.com/product-detail/en/rubycon/400BXW12MEFR10X16/1189-3126-ND/6049846; Tolerance: 20%; Voltage: 400V; Price: 1.09; Device Package: Radial, Can, 10mm
footprint CAP AL TH D10 L5 H22
pins: 1, 2

## 400BXW18MEFC10X20
designator C?, comment 18uF  (value not drawn)
CAP ALUM 18UF 20% 400V RADIAL; Part Number: 400BXW18MEFC10X20; Manufacturer: Rubycon; TemperatureRange: -25C ~ 105C; Type: Polar; Ripple Current: 220mA; Value: 18uF; PartId: 25990; Supplier 1: Digi-Key; Supplier Part Number 1: 1189-1314-ND; ComponentLink1Description: Datasheet; ComponentLink1URL: http://www.rubycon.co.jp/en/catalog/e_pdfs/aluminum/e_BXW.pdf; ComponentLink2Description: Digi-Key Listing; ComponentLink2URL: https://www.digikey.com/product-detail/en/rubycon/400BXW18MEFC10X20/1189-1314-ND/3134270; Tolerance: 20%; Voltage: 400V; Price: 1.03; Device Package: Radial, Can, 10mm
footprint CAP AL TH D10 L5 H22
pins: 1, 2

## 400BXW18MEFR10X20
designator C?, comment 18uF  (value not drawn)
CAP ALUM 18UF 20% 400V T/H; Part Number: 400BXW18MEFR10X20; Manufacturer: Rubycon; TemperatureRange: -40C ~ 105C; Type: Polar; Ripple Current: 220mA @ 120Hz; Value: 18uF; PartId: 25993; Supplier 1: Digi-Key; Supplier Part Number 1: 1189-3127-ND; ComponentLink1Description: Datasheet; ComponentLink1URL: http://www.rubycon.co.jp/en/catalog/e_pdfs/aluminum/e_BXW.pdf; ComponentLink2Description: Digi-Key Listing; ComponentLink2URL: https://www.digikey.com/product-detail/en/rubycon/400BXW18MEFR10X20/1189-3127-ND/6049901; Tolerance: 20%; Voltage: 400V; Price: 1.35; Device Package: Radial, Can, 10mm
footprint CAP AL TH D10 L5 H22
pins: 1, 2

## 400BXW18MEFR16X16
designator C?, comment 18uF  (value not drawn)
CAP ALUM 18UF 20% 400V T/H; Part Number: 400BXW18MEFR16X16; Manufacturer: Rubycon; TemperatureRange: -40C ~ 105C; Type: Polar; Ripple Current: 230mA @ 120Hz; Value: 18uF; PartId: 26347; Supplier 1: Digi-Key; Supplier Part Number 1: 1189-3128-ND; ComponentLink1Description: Datasheet; ComponentLink1URL: http://www.rubycon.co.jp/en/catalog/e_pdfs/aluminum/e_BXW.pdf; ComponentLink2Description: Digi-Key Listing; ComponentLink2URL: https://www.digikey.com/product-detail/en/rubycon/400BXW18MEFR16X16/1189-3128-ND/6049898; Tolerance: 20%; Voltage: 400V; Price: 1.83; Device Package: Radial, Can, 16mm
footprint CAP AL TH D16 L7.5 H20
pins: 1, 2

## 400BXW22MEFR10X25
designator C?, comment 22uF  (value not drawn)
CAP ALUM 22UF 20% 400V T/H; Part Number: 400BXW22MEFR10X25; Manufacturer: Rubycon; TemperatureRange: -40C ~ 105C; Type: Polar; Ripple Current: 240mA @ 120Hz; Value: 22uF; PartId: 26196; Supplier 1: Digi-Key; Supplier Part Number 1: 1189-3129-ND; ComponentLink1Description: Datasheet; ComponentLink1URL: http://www.rubycon.co.jp/en/catalog/e_pdfs/aluminum/e_BXW.pdf; ComponentLink2Description: Digi-Key Listing; ComponentLink2URL: https://www.digikey.com/product-detail/en/rubycon/400BXW22MEFR10X25/1189-3129-ND/6049902; Tolerance: 20%; Voltage: 400V; Price: 1.48; Device Package: Radial, Can, 10mm
footprint CAP AL TH D10 L5 H30
pins: 1, 2

## 400BXW27MEFC10X25
designator C?, comment 27uF  (value not drawn)
CAP ALUM 27UF 20% 400V RADIAL; Part Number: 400BXW27MEFC10X25; Manufacturer: Rubycon; TemperatureRange: -25C ~ 105C; Type: Polar; Ripple Current: 290mA; Value: 27uF; PartId: 26201; Supplier 1: Digi-Key; Supplier Part Number 1: 1189-1316-ND; ComponentLink1Description: Datasheet; ComponentLink1URL: http://www.rubycon.co.jp/en/catalog/e_pdfs/aluminum/e_BXW.pdf; ComponentLink2Description: Digi-Key Listing; ComponentLink2URL: https://www.digikey.com/product-detail/en/rubycon/400BXW27MEFC10X25/1189-1316-ND/3134272; Tolerance: 20%; Voltage: 400V; Price: 1.72; Device Package: Radial, Can, 10mm
footprint CAP AL TH D10 L5 H30
pins: 1, 2

## 400BXW27MEFR10X25
designator C?, comment 27uF  (value not drawn)
CAP ALUM 27UF 20% 400V T/H; Part Number: 400BXW27MEFR10X25; Manufacturer: Rubycon; TemperatureRange: -40C ~ 105C; Type: Polar; Ripple Current: 290mA @ 120Hz; Value: 27uF; PartId: 26198; Supplier 1: Digi-Key; Supplier Part Number 1: 1189-3130-ND; ComponentLink1Description: Datasheet; ComponentLink1URL: http://www.rubycon.co.jp/en/catalog/e_pdfs/aluminum/e_BXW.pdf; ComponentLink2Description: Digi-Key Listing; ComponentLink2URL: https://www.digikey.com/product-detail/en/rubycon/400BXW27MEFR10X25/1189-3130-ND/6049903; Tolerance: 20%; Voltage: 400V; Price: 1.53; Device Package: Radial, Can, 10mm
footprint CAP AL TH D10 L5 H30
pins: 1, 2

## 400BXW27MEFR12.5X20
designator C?, comment 27uF  (value not drawn)
CAP ALUM 27UF 20% 400V T/H; Part Number: 400BXW27MEFR12.5X20; Manufacturer: Rubycon; TemperatureRange: -40C ~ 105C; Type: Polar; Ripple Current: 850mA @ 120Hz; Value: 27uF; PartId: 23510; Supplier 1: Digi-Key; Supplier Part Number 1: 1189-3131-ND; ComponentLink1Description: Datasheet; ComponentLink1URL: http://www.rubycon.co.jp/en/catalog/e_pdfs/aluminum/e_BXW.pdf; ComponentLink2Description: Digi-Key Listing; ComponentLink2URL: https://www.digikey.com/product-detail/en/rubycon/400BXW27MEFR12.5X20/1189-3131-ND/6049904; Tolerance: 20%; Voltage: 400V; Price: 1.56; Device Package: Radial, Can, 12.5mm
footprint CAP AL TH D12.5 L5 H22
pins: 1, 2

## 400BXW39MEFR12.5X25
designator C?, comment 39uF  (value not drawn)